# Altium footprint library Connectors THD.PcbLib: 631 footprints (part 43 of 46)
Each footprint in its own frame and in the unit in brackets; x right, y up, seen from the top. Pads: shape width x height; smd on the part's side, far side on the other; paste and mask are expansions set on the pad; w line width, h text height; cw(c..) or ccw(c..) is an arc to the next point about the centre after c.
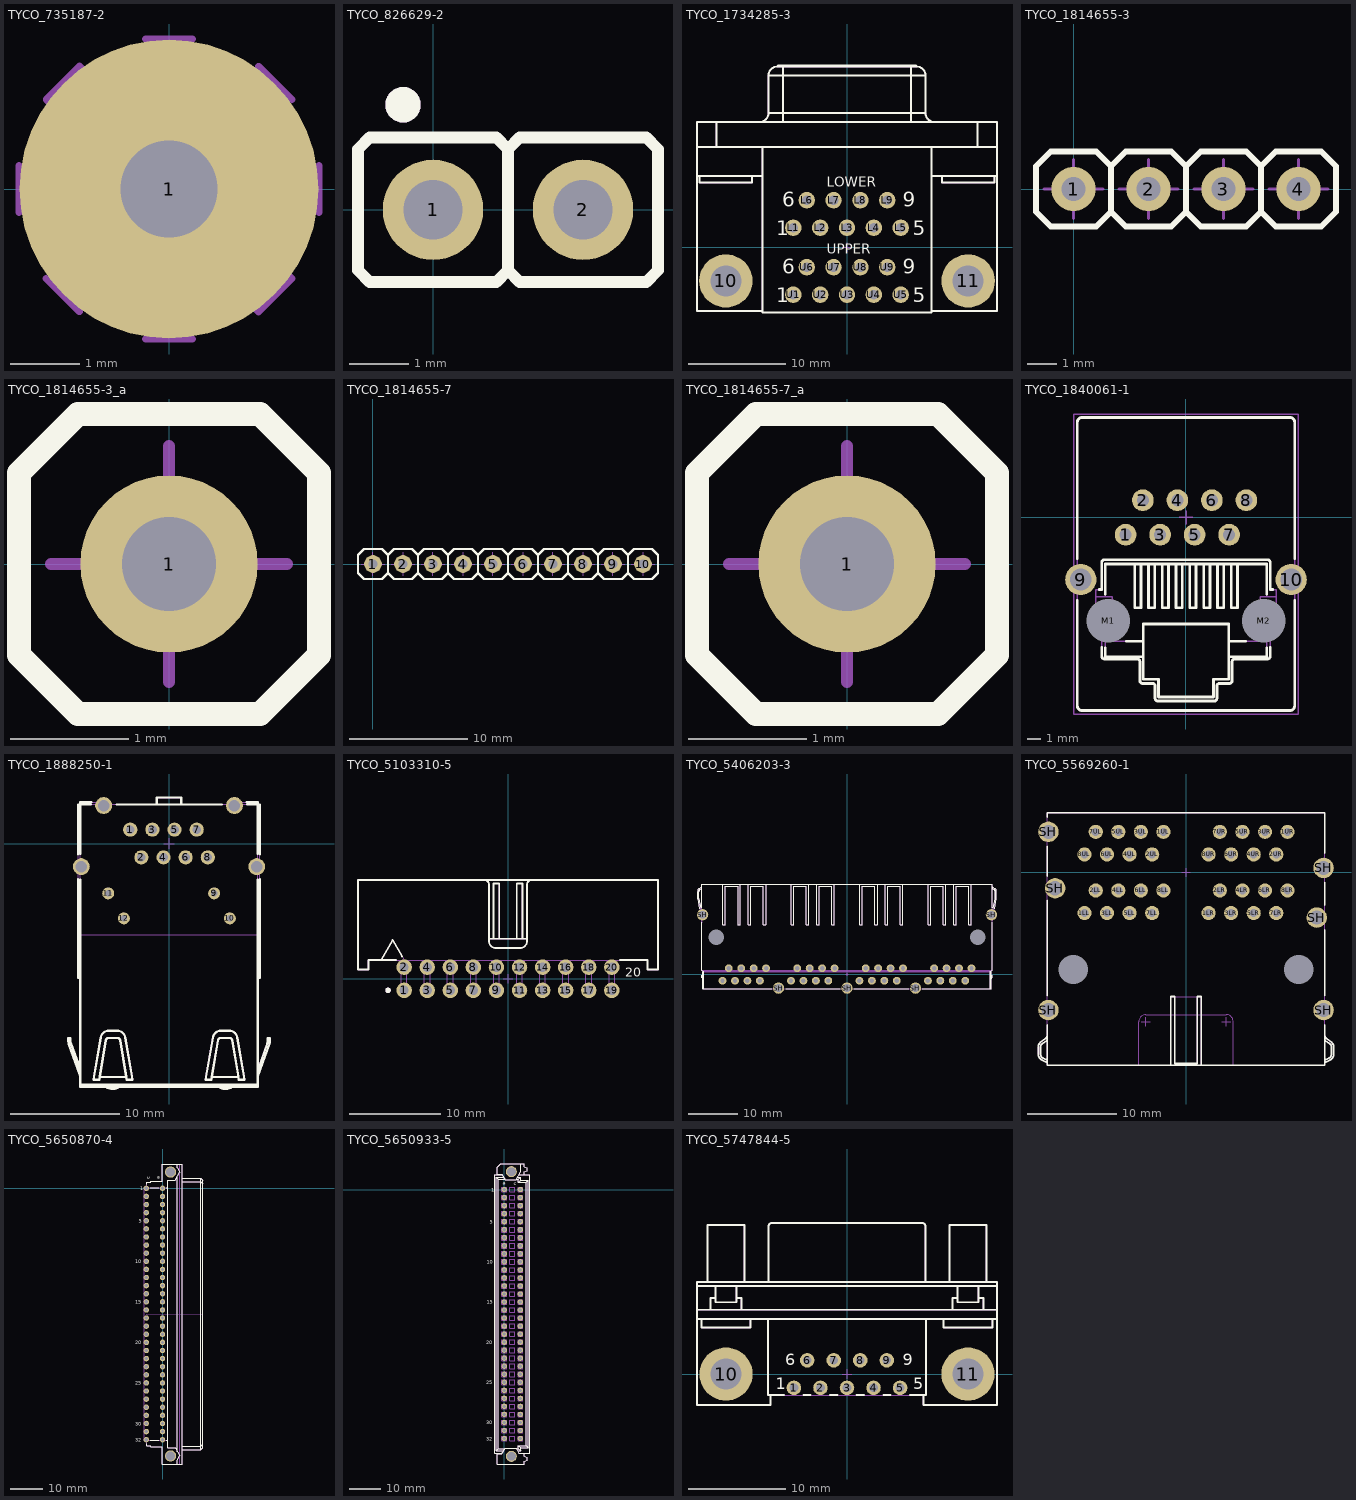
[diagram p42: the footprints below, top view; thin cyan lines are the x and y axes]

## TYCO_735187-2 [mm] "2.8mm FASTON Tab For PC Board (1.4mm hole)"
height 8.6
pads (1):
  round 4.3 hole 1.4 mask-0.7: 1(0,0)
Mechanical 14:
  lines w0.1: -2.159,-0.34 -2.159,0.34 ; -1.767,-1.286 -1.286,-1.767 ; -0.34,-2.159 0.34,-2.159 ; -0.34,2.159 0.34,2.159 ; 1.286,1.767 1.767,1.286 ; 2.159,-0.34 2.159,0.34 ; -1.767,1.286 -1.286,1.767 1.767,-1.286 1.286,-1.767 -1.767,1.286
3D body: height 8.64, standoff -3.81, extent -1.642,-1.642 1.767,1.767

## TYCO_826629-2 [mm] "2 Contacts Straight Strip Header Pitch 2.54mm L=6.7mm ''Mini-Wire-Wrap''"
height 9.5
pads (2):
  round 1.7 hole 1: 1(0,0) 2(2.54,0)
Top Overlay:
  circle w0.3: c-0.508,1.778 r0.15
  lines w0.2: 1.27,-1.025 1.47,-1.225 3.61,-1.225 3.81,-1.025 3.81,1.025 3.61,1.225 1.47,1.225 1.27,1.025 ; 1.27,-1.025 1.27,1.025 ; 1.27,-1.025 1.07,-1.225 -1.07,-1.225 -1.27,-1.025 -1.27,1.025 -1.07,1.225 1.07,1.225 1.27,1.025
Mechanical 14:
  circle w0.3: c-0.508,1.778 r0.15
  lines w0.1: 1.27,-1.025 1.47,-1.225 3.61,-1.225 3.81,-1.025 3.81,1.025 3.61,1.225 1.47,1.225 1.27,1.025 ; 1.27,-1.025 1.27,1.025 ; 1.27,-1.025 1.07,-1.225 -1.07,-1.225 -1.27,-1.025 -1.27,1.025 -1.07,1.225 1.07,1.225 1.27,1.025
3D body: height 9.5, standoff -3.2, extent -1.22,-1.25 3.86,1.25

## TYCO_1734285-3 [mm] "Dual Stacked  Right Angled D-SUB 9 Pins Female Connector, With Threaded Insert UNC 4-40, And PCB Mount Retention"
height 31.9
pads (20):
  round 5.5 hole 3.2: 10(-12.495,-3.455) 11(12.495,-3.455)
  round 1.7 hole 1: L1(-5.54,2.035) L2(-2.77,2.035) L3(0,2.035) L4(2.77,2.035) L5(5.54,2.035) L6(-4.155,4.875) L7(-1.385,4.875) L8(1.385,4.875) L9(4.155,4.875) U1(-5.54,-4.875) U2(-2.77,-4.875) U3(0,-4.875) U4(2.77,-4.875) U5(5.54,-4.875) U6(-4.155,-2.035) U7(-1.385,-2.035) U8(1.385,-2.035) U9(4.155,-2.035)
Top Overlay:
  lines w0.2: -15.475,7.355 -8.725,7.355 ; -15.475,10.355 15.475,10.355 ; -15.195,7.355 -15.195,6.691 -9.795,6.691 -9.795,7.355 ; -13.475,10.355 -13.475,12.955 ; -9,12.955 ccw(c-9,13.855) -8.1,13.855 ; -8.725,-6.545 -15.475,-6.545 -15.475,12.955 15.475,12.955 15.475,-6.545 8.725,-6.545 ; -8.725,10.355 -8.725,-6.695 8.725,-6.695 8.725,10.355 ; -7.1,18.655 -7.1,18.755 7.1,18.755 7.1,18.655 ; -6.6,12.955 -6.6,18.755 ; 6.6,12.955 6.6,18.755 ; 8.725,7.355 15.475,7.355 ; 9,12.955 cw(c9,13.855) 8.1,13.855 ; 9.795,7.355 9.795,6.691 15.195,6.691 15.195,7.355 ; 13.475,10.355 13.475,12.955 ; -8.1,13.855 -8.1,17.755 ; -8.1,13.855 8.1,13.855 ; -8.1,17.755 cw(c-7.2,17.755) -7.2,18.655 7.199,18.655 cw(c7.2,17.755) 8.1,17.755 ; -8.1,17.755 8.1,17.755 ; 8.1,13.855 8.1,17.755
  text "9" at 5.726,4.188 h1.5
  text "5" at 6.791,1.273 h1.5
  text "5" at 6.791,-5.637 h1.5
  text "9" at 5.726,-2.722 h1.5
  text "LOWER" at -2.1,6.26 h1
  text "UPPER" at -2.1,-0.65 h1
  text "1" at -7.299,1.273 h1.5
  text "6" at -6.661,4.188 h1.5
  text "6" at -6.661,-2.722 h1.5
  text "1" at -7.299,-5.637 h1.5
Mechanical 7:
  lines w0.1: -12.995,-3.455 -12.495,-3.455 ; -12.495,-3.955 -12.495,-3.455 ; -12.495,-2.955 -12.495,-3.455 ; -11.995,-3.455 -12.495,-3.455 ; 11.995,-3.455 12.495,-3.455 ; 12.495,-3.955 12.495,-3.455 ; 12.495,-2.955 12.495,-3.455 ; 12.995,-3.455 12.495,-3.455
Mechanical 8:
  lines w0.1: -6.04,-4.875 -5.54,-4.875 ; -6.04,2.035 -5.54,2.035 ; -5.54,-5.375 -5.54,-4.875 ; -5.54,-4.375 -5.54,-4.875 ; -5.54,1.535 -5.54,2.035 ; -5.54,2.535 -5.54,2.035 ; -5.04,-4.875 -5.54,-4.875 ; -5.04,2.035 -5.54,2.035 ; -4.655,-2.035 -4.155,-2.035 ; -4.655,4.875 -4.155,4.875 ; -4.155,-2.535 -4.155,-2.035 ; -4.155,-1.535 -4.155,-2.035 ; -4.155,4.375 -4.155,4.875 ; -4.155,5.375 -4.155,4.875 ; -3.655,-2.035 -4.155,-2.035 ; -3.655,4.875 -4.155,4.875 ; -3.27,-4.875 -2.77,-4.875 ; -3.27,2.035 -2.77,2.035 ; -2.77,-5.375 -2.77,-4.875 ; -2.77,-4.375 -2.77,-4.875 ; -2.77,1.535 -2.77,2.035 ; -2.77,2.535 -2.77,2.035 ; -2.27,-4.875 -2.77,-4.875 ; -2.27,2.035 -2.77,2.035 ; -1.885,-2.035 -1.385,-2.035 ; -1.885,4.875 -1.385,4.875 ; -1.385,-2.535 -1.385,-2.035 ; -1.385,-1.535 -1.385,-2.035 ; -1.385,4.375 -1.385,4.875 ; -1.385,5.375 -1.385,4.875 ; -0.885,-2.035 -1.385,-2.035 ; -0.885,4.875 -1.385,4.875 ; -0.5,-4.875 0,-4.875 ; -0.5,0 0,0 ; -0.5,2.035 0,2.035 ; 0,-5.375 0,-4.875 ; 0,-4.375 0,-4.875 ; 0,-0.5 0,0 ; 0,0.5 0,0 ; 0,1.535 0,2.035 ; 0,2.535 0,2.035 ; 0.5,-4.875 0,-4.875 ; 0.5,0 0,0 ; 0.5,2.035 0,2.035 ; 0.885,-2.035 1.385,-2.035 ; 0.885,4.875 1.385,4.875 ; 1.385,-2.535 1.385,-2.035 ; 1.385,-1.535 1.385,-2.035 ; 1.385,4.375 1.385,4.875 ; 1.385,5.375 1.385,4.875 ; 1.885,-2.035 1.385,-2.035 ; 1.885,4.875 1.385,4.875 ; 2.27,-4.875 2.77,-4.875 ; 2.27,2.035 2.77,2.035 ; 2.77,-5.375 2.77,-4.875 ; 2.77,-4.375 2.77,-4.875 ; 2.77,1.535 2.77,2.035 ; 2.77,2.535 2.77,2.035 ; 3.27,-4.875 2.77,-4.875 ; 3.27,2.035 2.77,2.035 ; 3.655,-2.035 4.155,-2.035 ; 3.655,4.875 4.155,4.875 ; 4.155,-2.535 4.155,-2.035 ; 4.155,-1.535 4.155,-2.035 ; 4.155,4.375 4.155,4.875 ; 4.155,5.375 4.155,4.875 ; 4.655,-2.035 4.155,-2.035 ; 4.655,4.875 4.155,4.875 ; 5.04,-4.875 5.54,-4.875 ; 5.04,2.035 5.54,2.035 ; 5.54,-5.375 5.54,-4.875 ; 5.54,-4.375 5.54,-4.875 ; 5.54,1.535 5.54,2.035 ; 5.54,2.535 5.54,2.035 ; 6.04,-4.875 5.54,-4.875 ; 6.04,2.035 5.54,2.035
Mechanical 14:
  drawing of 6657 lines, arcs and shapes, not listed
  text "LOWER" at -2.1,6.26 h1
  text "UPPER" at -2.1,-0.65 h1
  text "1" at -7.299,-5.637 h1.5
  text "6" at -6.661,-2.722 h1.5
  text "6" at -6.661,4.188 h1.5
  text "1" at -7.299,1.273 h1.5
  text "9" at 5.726,-2.722 h1.5
  text "5" at 6.791,-5.637 h1.5
  text "5" at 6.791,1.273 h1.5
  text "9" at 5.726,4.188 h1.5
3D body: height 31.6, standoff -3.55, extent -15.475,-6.695 15.475,18.805

## TYCO_1814655-3 [mm] "4 Positions, Pitch 2.54mm, Width 2.54mm, Heigh 4.4mm, SIP Straight Socket"
height 4.4
pads (4):
  round 1.5 hole 0.8: 1(0,0) 2(2.54,0) 3(5.08,0) 4(7.62,0)
Top Overlay:
  lines w0.2: 1.27,-0.77 1.27,0.77 ; 1.27,-0.77 1.77,-1.27 3.31,-1.27 3.81,-0.77 ; 1.27,-0.77 0.77,-1.27 -0.77,-1.27 -1.27,-0.77 -1.27,0.77 -0.77,1.27 0.77,1.27 1.27,0.77 ; 1.27,0.77 1.77,1.27 3.31,1.27 3.81,0.77 ; 3.81,-0.77 3.81,0.77 ; 3.81,-0.77 4.31,-1.27 5.85,-1.27 6.35,-0.77 ; 3.81,0.77 4.31,1.27 5.85,1.27 6.35,0.77 ; 6.35,-0.77 6.35,0.77 ; 6.35,-0.77 6.85,-1.27 8.39,-1.27 8.89,-0.77 8.89,0.77 8.39,1.27 6.85,1.27 6.35,0.77
Mechanical 8:
  lines w0.1: -1,0 0,0 ; 0,-1 0,0 ; 0,1 0,0 ; 1,0 0,0 ; 1.54,0 2.54,0 ; 2.54,-1 2.54,0 ; 2.54,1 2.54,0 ; 3.54,0 2.54,0 ; 4.08,0 5.08,0 ; 5.08,-1 5.08,0 ; 5.08,1 5.08,0 ; 6.08,0 5.08,0 ; 6.62,0 7.62,0 ; 7.62,-1 7.62,0 ; 7.62,1 7.62,0 ; 8.62,0 7.62,0
Mechanical 14:
  lines w0.1: 1.27,-0.77 1.27,0.77 ; 1.27,-0.77 1.77,-1.27 3.31,-1.27 3.81,-0.77 ; 1.27,-0.77 0.77,-1.27 -0.77,-1.27 -1.27,-0.77 -1.27,0.77 -0.77,1.27 0.77,1.27 1.27,0.77 ; 1.27,0.77 1.77,1.27 3.31,1.27 3.81,0.77 ; 3.81,-0.77 3.81,0.77 ; 3.81,-0.77 4.31,-1.27 5.85,-1.27 6.35,-0.77 ; 3.81,0.77 4.31,1.27 5.85,1.27 6.35,0.77 ; 6.35,-0.77 6.35,0.77 ; 6.35,-0.77 6.85,-1.27 8.39,-1.27 8.89,-0.77 8.89,0.77 8.39,1.27 6.85,1.27 6.35,0.77
3D body: height 4.4, standoff -2.9, extent -1.27,-1.27 8.89,1.27

## TYCO_1814655-3_a [mm] "1 of 4 Positions, Pitch 2.54mm, Width 2.54mm, Heigh 4.4mm, SIP Straight Socket"
height 4.4
pads (1):
  round 1.5 hole 0.8: 1(0,0)
Top Overlay:
  lines w0.2: -1.27,-0.77 -0.77,-1.27 0.77,-1.27 1.27,-0.77 1.27,0.77 0.77,1.27 -0.77,1.27 -1.27,0.77 -1.27,-0.77
Mechanical 8:
  lines w0.1: -1,0 0,0 ; 0,-1 0,0 ; 0,1 0,0 ; 1,0 0,0
Mechanical 14:
  lines w0.1: -1.27,-0.77 -0.77,-1.27 0.77,-1.27 1.27,-0.77 1.27,0.77 0.77,1.27 -0.77,1.27 -1.27,0.77 -1.27,-0.77
3D body: height 4.4, standoff -2.9, extent -1.27,-1.27 1.27,1.27

## TYCO_1814655-7 [mm] "10 Positions, Pitch 2.54mm, Width 2.54mm, Heigh 4.4mm, SIP Straight Socket"
height 4.4
pads (10):
  round 1.5 hole 0.8: 1(0,0) 2(2.54,0) 3(5.08,0) 4(7.62,0) 5(10.16,0) 6(12.7,0) 7(15.24,0) 8(17.78,0) 9(20.32,0) 10(22.86,0)
Top Overlay:
  lines w0.2: 1.27,-0.77 1.27,0.77 ; 1.27,-0.77 1.77,-1.27 3.31,-1.27 3.81,-0.77 ; 1.27,-0.77 0.77,-1.27 -0.77,-1.27 -1.27,-0.77 -1.27,0.77 -0.77,1.27 0.77,1.27 1.27,0.77 ; 1.27,0.77 1.77,1.27 3.31,1.27 3.81,0.77 ; 3.81,-0.77 3.81,0.77 ; 3.81,-0.77 4.31,-1.27 5.85,-1.27 6.35,-0.77 ; 3.81,0.77 4.31,1.27 5.85,1.27 6.35,0.77 ; 6.35,-0.77 6.35,0.77 ; 6.35,-0.77 6.85,-1.27 8.39,-1.27 8.89,-0.77 ; 6.35,0.77 6.85,1.27 8.39,1.27 8.89,0.77 ; 8.89,-0.77 8.89,0.77 ; 8.89,-0.77 9.39,-1.27 10.93,-1.27 11.43,-0.77 ; 8.89,0.77 9.39,1.27 10.93,1.27 11.43,0.77 ; 11.43,-0.77 11.43,0.77 ; 11.43,-0.77 11.93,-1.27 13.47,-1.27 13.97,-0.77 ; 11.43,0.77 11.93,1.27 13.47,1.27 13.97,0.77 ; 13.97,-0.77 13.97,0.77 ; 13.97,-0.77 14.47,-1.27 16.01,-1.27 16.51,-0.77 ; 13.97,0.77 14.47,1.27 16.01,1.27 16.51,0.77 ; 16.51,-0.77 16.51,0.77 ; 16.51,-0.77 17.01,-1.27 18.55,-1.27 19.05,-0.77 ; 16.51,0.77 17.01,1.27 18.55,1.27 19.05,0.77 ; 19.05,-0.77 19.05,0.77 ; 19.05,-0.77 19.55,-1.27 21.09,-1.27 21.59,-0.77 ; 19.05,0.77 19.55,1.27 21.09,1.27 21.59,0.77 ; 21.59,-0.77 21.59,0.77 ; 21.59,-0.77 22.09,-1.27 23.63,-1.27 24.13,-0.77 24.13,0.77 23.63,1.27 22.09,1.27 21.59,0.77
Mechanical 8:
  lines w0.1: -1,0 0,0 ; 0,-1 0,0 ; 0,1 0,0 ; 1,0 0,0 ; 1.54,0 2.54,0 ; 2.54,-1 2.54,0 ; 2.54,1 2.54,0 ; 3.54,0 2.54,0 ; 4.08,0 5.08,0 ; 5.08,-1 5.08,0 ; 5.08,1 5.08,0 ; 6.08,0 5.08,0 ; 6.62,0 7.62,0 ; 7.62,-1 7.62,0 ; 7.62,1 7.62,0 ; 8.62,0 7.62,0 ; 9.16,0 10.16,0 ; 10.16,-1 10.16,0 ; 10.16,1 10.16,0 ; 11.16,0 10.16,0 ; 11.7,0 12.7,0 ; 12.7,-1 12.7,0 ; 12.7,1 12.7,0 ; 13.7,0 12.7,0 ; 14.24,0 15.24,0 ; 15.24,-1 15.24,0 ; 15.24,1 15.24,0 ; 16.24,0 15.24,0 ; 16.78,0 17.78,0 ; 17.78,-1 17.78,0 ; 17.78,1 17.78,0 ; 18.78,0 17.78,0 ; 19.32,0 20.32,0 ; 20.32,-1 20.32,0 ; 20.32,1 20.32,0 ; 21.32,0 20.32,0 ; 21.86,0 22.86,0 ; 22.86,-1 22.86,0 ; 22.86,1 22.86,0 ; 23.86,0 22.86,0
Mechanical 14:
  lines w0.1: 1.27,-0.77 1.27,0.77 ; 1.27,-0.77 1.77,-1.27 3.31,-1.27 3.81,-0.77 ; 1.27,-0.77 0.77,-1.27 -0.77,-1.27 -1.27,-0.77 -1.27,0.77 -0.77,1.27 0.77,1.27 1.27,0.77 ; 1.27,0.77 1.77,1.27 3.31,1.27 3.81,0.77 ; 3.81,-0.77 3.81,0.77 ; 3.81,-0.77 4.31,-1.27 5.85,-1.27 6.35,-0.77 ; 3.81,0.77 4.31,1.27 5.85,1.27 6.35,0.77 ; 6.35,-0.77 6.35,0.77 ; 6.35,-0.77 6.85,-1.27 8.39,-1.27 8.89,-0.77 ; 6.35,0.77 6.85,1.27 8.39,1.27 8.89,0.77 ; 8.89,-0.77 8.89,0.77 ; 8.89,-0.77 9.39,-1.27 10.93,-1.27 11.43,-0.77 ; 8.89,0.77 9.39,1.27 10.93,1.27 11.43,0.77 ; 11.43,-0.77 11.43,0.77 ; 11.43,-0.77 11.93,-1.27 13.47,-1.27 13.97,-0.77 ; 11.43,0.77 11.93,1.27 13.47,1.27 13.97,0.77 ; 13.97,-0.77 13.97,0.77 ; 13.97,-0.77 14.47,-1.27 16.01,-1.27 16.51,-0.77 ; 13.97,0.77 14.47,1.27 16.01,1.27 16.51,0.77 ; 16.51,-0.77 16.51,0.77 ; 16.51,-0.77 17.01,-1.27 18.55,-1.27 19.05,-0.77 ; 16.51,0.77 17.01,1.27 18.55,1.27 19.05,0.77 ; 19.05,-0.77 19.05,0.77 ; 19.05,-0.77 19.55,-1.27 21.09,-1.27 21.59,-0.77 ; 19.05,0.77 19.55,1.27 21.09,1.27 21.59,0.77 ; 21.59,-0.77 21.59,0.77 ; 21.59,-0.77 22.09,-1.27 23.63,-1.27 24.13,-0.77 24.13,0.77 23.63,1.27 22.09,1.27 21.59,0.77
3D body: height 4.4, standoff -2.9, extent -1.27,-1.27 24.13,1.27

## TYCO_1814655-7_a [mm] "1 of 10 Positions, Pitch 2.54mm, Width 2.54mm, Heigh 4.4mm, SIP Straight Socket"
height 4.4
pads (1):
  round 1.5 hole 0.8: 1(0,0)
Top Overlay:
  lines w0.2: -1.27,-0.77 -0.77,-1.27 0.77,-1.27 1.27,-0.77 1.27,0.77 0.77,1.27 -0.77,1.27 -1.27,0.77 -1.27,-0.77
Mechanical 8:
  lines w0.1: -1,0 0,0 ; 0,-1 0,0 ; 0,1 0,0 ; 1,0 0,0
Mechanical 14:
  lines w0.1: -1.27,-0.77 -0.77,-1.27 0.77,-1.27 1.27,-0.77 1.27,0.77 0.77,1.27 -0.77,1.27 -1.27,0.77 -1.27,-0.77
3D body: height 4.4, standoff -2.9, extent -1.27,-1.27 1.27,1.27

## TYCO_1840061-1 [mm] "1 Port, Without LED, RJ45 10/100Base-T Ethernet Vertical Connector Module With Integrated Magnetics"
height 16.51
pads (12):
  round 1.6 hole 0.9: 1(-4.445,-1.27) 2(-3.175,1.27) 3(-1.905,-1.27) 4(-0.635,1.27) 5(0.635,-1.27) 6(1.905,1.27) 7(3.175,-1.27) 8(4.445,1.27)
  round 2.3 hole 1.6: 9(-7.747,-4.572) 10(7.747,-4.572)
  round 1 hole 3.2 unplated mask+1.1: M1(-5.715,-7.62) M2(5.715,-7.62)
Top Overlay:
  lines w0.2: -8,-6.101 -8,-13.87 ccw(c-7.65,-13.87) -7.65,-14.22 7.65,-14.22 ccw(c7.65,-13.87) 8,-13.87 8,-6.101 ; -8,-3.043 -8,7.02 cw(c-7.65,7.02) -7.65,7.37 7.65,7.37 cw(c7.65,7.02) 8,7.02 8,-3.043 ; -6.382,-5.31 -6.2,-5.31 -6.2,-3.31 cw(c-6,-3.31) -6,-3.11 6,-3.11 cw(c6,-3.31) 6.2,-3.31 6.2,-5.31 6.382,-5.31 ; -6.2,-9.562 -6.2,-10.22 ccw(c-6,-10.22) -6,-10.42 -3.595,-10.42 cw(c-3.595,-10.62) -3.395,-10.62 -3.395,-12.02 ccw(c-3.195,-12.02) -3.195,-12.22 -2.475,-12.22 cw(c-2.475,-12.42) -2.275,-12.42 -2.275,-13.32 ccw(c-2.075,-13.32) -2.075,-13.52 2.075,-13.52 ccw(c2.075,-13.32) 2.275,-13.32 2.275,-12.42 cw(c2.475,-12.42) 2.475,-12.22 3.195,-12.22 ccw(c3.195,-12.02) 3.395,-12.02 3.395,-10.62 cw(c3.595,-10.62) 3.595,-10.42 6,-10.42 ccw(c6,-10.22) 6.2,-10.22 6.2,-9.562 ; -5.955,-9.607 -5.955,-10.25 -3.15,-10.25 ; -5.955,-5.636 -5.955,-3.42 5.955,-3.42 5.955,-5.636 ; -4.379,-9.11 -3.15,-9.11 ; -3.78,-3.42 -3.78,-6.654 -3.32,-6.654 -3.32,-3.42 ; -2.764,-3.42 -2.764,-6.654 -2.304,-6.654 -2.304,-3.42 ; -1.748,-3.42 -1.748,-6.654 -1.288,-6.654 -1.288,-3.42 ; -0.732,-3.42 -0.732,-6.654 -0.272,-6.654 -0.272,-3.42 ; 0.284,-3.42 0.284,-6.654 0.744,-6.654 0.744,-3.42 ; 1.3,-3.42 1.3,-6.654 1.76,-6.654 1.76,-3.42 ; 2.316,-3.42 2.316,-6.654 2.776,-6.654 2.776,-3.42 ; 3.15,-10.25 5.955,-10.25 5.955,-9.607 ; 3.15,-9.11 4.379,-9.11 ; 3.332,-3.42 3.332,-6.654 3.792,-6.654 3.792,-3.42 ; -3.15,-11.92 -2.03,-11.92 -2.03,-13.22 2.03,-13.22 2.03,-11.92 3.15,-11.92 3.15,-7.84 -3.15,-7.84 -3.15,-11.92
Mechanical 8:
  lines w0.1: -8.245,-4.572 -7.745,-4.572 ; -7.745,-5.072 -7.745,-4.572 ; -7.745,-4.072 -7.745,-4.572 ; -7.245,-4.572 -7.745,-4.572 ; -6.215,-7.622 -5.715,-7.622 ; -5.715,-8.122 -5.715,-7.622 ; -5.715,-7.122 -5.715,-7.622 ; -5.215,-7.622 -5.715,-7.622 ; -4.945,-1.272 -4.445,-1.272 ; -4.445,-1.772 -4.445,-1.272 ; -4.445,-0.772 -4.445,-1.272 ; -3.945,-1.272 -4.445,-1.272 ; -3.675,1.268 -3.175,1.268 ; -3.175,0.768 -3.175,1.268 ; -3.175,1.768 -3.175,1.268 ; -2.675,1.268 -3.175,1.268 ; -2.405,-1.272 -1.905,-1.272 ; -1.905,-1.772 -1.905,-1.272 ; -1.905,-0.772 -1.905,-1.272 ; -1.405,-1.272 -1.905,-1.272 ; -1.135,1.268 -0.635,1.268 ; -0.635,0.768 -0.635,1.268 ; -0.635,1.768 -0.635,1.268 ; -0.5,0 0,0 ; -0.135,1.268 -0.635,1.268 ; 0,-0.5 0,0 ; 0,0.5 0,0 ; 0.135,-1.272 0.635,-1.272 ; 0.5,0 0,0 ; 0.635,-1.772 0.635,-1.272 ; 0.635,-0.772 0.635,-1.272 ; 1.135,-1.272 0.635,-1.272 ; 1.405,1.268 1.905,1.268 ; 1.905,0.768 1.905,1.268 ; 1.905,1.768 1.905,1.268 ; 2.405,1.268 1.905,1.268 ; 2.675,-1.272 3.175,-1.272 ; 3.175,-1.772 3.175,-1.272 ; 3.175,-0.772 3.175,-1.272 ; 3.675,-1.272 3.175,-1.272 ; 3.945,1.268 4.445,1.268 ; 4.445,0.768 4.445,1.268 ; 4.445,1.768 4.445,1.268 ; 4.945,1.268 4.445,1.268 ; 5.215,-7.622 5.715,-7.622 ; 5.715,-8.122 5.715,-7.622 ; 5.715,-7.122 5.715,-7.622 ; 6.215,-7.622 5.715,-7.622 ; 7.245,-4.572 7.745,-4.572 ; 7.745,-5.072 7.745,-4.572 ; 7.745,-4.072 7.745,-4.572 ; 8.245,-4.572 7.745,-4.572
Mechanical 14:
  lines w0.1: -6.635,-7.85 -5.449,-7.85 -5.449,-5.82 -6.635,-5.82 ; -5.955,-9.11 -3.15,-9.11 ; -5.955,-7.85 -5.955,-10.25 -3.15,-10.25 ; -5.955,-5.82 -5.955,-3.42 5.955,-3.42 5.955,-5.82 ; -3.78,-3.42 -3.78,-6.654 -3.32,-6.654 -3.32,-3.42 ; -2.764,-3.42 -2.764,-6.654 -2.304,-6.654 -2.304,-3.42 ; -1.748,-3.42 -1.748,-6.654 -1.288,-6.654 -1.288,-3.42 ; -0.732,-3.42 -0.732,-6.654 -0.272,-6.654 -0.272,-3.42 ; 0.284,-3.42 0.284,-6.654 0.744,-6.654 0.744,-3.42 ; 1.3,-3.42 1.3,-6.654 1.76,-6.654 1.76,-3.42 ; 2.316,-3.42 2.316,-6.654 2.776,-6.654 2.776,-3.42 ; 3.15,-10.25 5.955,-10.25 5.955,-7.85 ; 3.15,-9.11 5.954,-9.11 ; 3.332,-3.42 3.332,-6.654 3.792,-6.654 3.792,-3.42 ; 6.635,-7.85 5.48,-7.85 5.48,-5.82 6.635,-5.82 ; -8,-13.87 ccw(c-7.65,-13.87) -7.65,-14.22 7.65,-14.22 ccw(c7.65,-13.87) 8,-13.87 8,7.02 ccw(c7.65,7.02) 7.65,7.37 -7.65,7.37 ccw(c-7.65,7.02) -8,7.02 -8,-13.87 ; -6.635,-8.36 -6.635,-5.31 -6.2,-5.31 -6.2,-3.31 cw(c-6,-3.31) -6,-3.11 6,-3.11 cw(c6,-3.31) 6.2,-3.31 6.2,-5.31 6.635,-5.31 6.635,-8.36 6.2,-8.36 6.2,-10.22 cw(c6,-10.22) 6,-10.42 3.595,-10.42 ccw(c3.595,-10.62) 3.395,-10.62 3.395,-12.02 cw(c3.195,-12.02) 3.195,-12.22 2.475,-12.22 ccw(c2.475,-12.42) 2.275,-12.42 2.275,-13.32 cw(c2.075,-13.32) 2.075,-13.52 -2.075,-13.52 cw(c-2.075,-13.32) -2.275,-13.32 -2.275,-12.42 ccw(c-2.475,-12.42) -2.475,-12.22 -3.195,-12.22 cw(c-3.195,-12.02) -3.395,-12.02 -3.395,-10.62 ccw(c-3.595,-10.62) -3.595,-10.42 -6,-10.42 cw(c-6,-10.22) -6.2,-10.22 -6.2,-8.36 -6.635,-8.36 ; -3.15,-11.92 -2.03,-11.92 -2.03,-13.22 2.03,-13.22 2.03,-11.92 3.15,-11.92 3.15,-7.84 -3.15,-7.84 -3.15,-11.92
Mechanical 15:
  lines w0.1: -8.25,-14.47 8.25,-14.47 8.25,7.62 -8.25,7.62 -8.25,-14.47
3D body: height 16.51, standoff -4, extent -8,-14.22 8,7.37

## TYCO_1888250-1 [mm] "1 Port, Yellow/Green LEDs, RJ45 10/100Base-T, Cat 5, Ethernet Connector Module"
height 7.38
pads (16):
  round 1.3 hole 0.8: 1(-3.556,1.27) 2(-2.54,-1.27) 3(-1.524,1.27) 4(-0.508,-1.27) 5(0.508,1.27) 6(1.524,-1.27) 7(2.54,1.27) 8(3.556,-1.27)
  round 1.1 hole 0.6: 9(4.14,-4.57) 10(5.58,-6.87) 11(-5.58,-4.57) 12(-4.14,-6.87)
  round 1.55 hole 1.05: SHIELD(-8.045,-2.12) SHIELD(-6,3.48) SHIELD(6,3.48) SHIELD(8.045,-2.12)
Top Overlay:
  lines w0.2: -8.345,-3.256 -8.345,-12.32 -8.145,-12.32 ; -8.345,-0.984 -8.345,3.58 -7.171,3.58 ; -8.145,-22.12 8.145,-22.12 ; -8.145,-20.703 -9.015,-18.311 cw(c-8.545,-18.14) -9.045,-18.14 -9.045,-17.84 -9.245,-17.84 -9.245,-18.14 ccw(c-8.545,-18.14) -9.203,-18.379 -8.19,-21.164 ; -8.145,-3.291 -8.145,-22.32 8.145,-22.32 8.145,-3.291 ; -8.145,-0.949 -8.145,3.78 -7.136,3.78 ; -5.841,-22.326 ccw(c-5.029,-20.72) -5.16,-22.515 ccw(c-5.291,-20.72) -4.47,-22.322 ; -4.829,3.58 4.829,3.58 ; -4.482,-18.052 ccw(c-4.729,-18.09) -4.729,-17.84 -5.551,-17.84 ccw(c-5.551,-18.09) -5.798,-18.052 -6.359,-21.42 ; -4.475,-18.051 -3.921,-21.42 ; -1.119,3.58 -1.119,4.22 1.125,4.22 1.125,3.58 ; 4.471,-22.322 ccw(c5.291,-20.72) 5.16,-22.515 ccw(c5.029,-20.72) 5.843,-22.325 ; 5.798,-18.052 ccw(c5.551,-18.09) 5.551,-17.84 4.729,-17.84 ccw(c4.729,-18.09) 4.482,-18.052 3.921,-21.42 ; 5.805,-18.051 6.359,-21.42 ; 7.136,3.78 8.145,3.78 8.145,-0.949 ; 7.171,3.58 8.345,3.58 8.345,-0.984 ; 8.145,-21.42 8.165,-21.303 9.205,-18.374 ccw(c8.545,-18.14) 9.245,-18.14 ; 8.145,-20.762 9.016,-18.307 ccw(c8.545,-18.14) 9.045,-18.14 9.045,-17.84 9.245,-17.84 9.245,-18.143 ; 8.145,-12.32 8.345,-12.32 8.345,-3.256 ; -8.19,-21.164 -8.145,-21.42 -8.19,-21.164 ; -6.359,-21.42 -6.39,-21.67 -6.938,-21.67 -6.257,-17.79 cw(c-5.519,-17.92) -5.519,-17.17 -4.761,-17.17 cw(c-4.761,-17.92) -4.023,-17.79 -3.342,-21.67 -3.89,-21.67 -3.921,-21.42 ; -6.359,-21.42 -3.921,-21.42 ; 3.921,-21.42 3.89,-21.67 3.342,-21.67 4.023,-17.79 cw(c4.761,-17.92) 4.761,-17.17 5.519,-17.17 cw(c5.519,-17.92) 6.257,-17.79 6.938,-21.67 6.39,-21.67 6.359,-21.42 ; 3.921,-21.42 6.359,-21.42
Mechanical 8:
  lines w0.1: -8.545,-2.12 -8.045,-2.12 ; -8.15,-8.37 8.15,-8.37 ; -8.045,-2.62 -8.045,-2.12 ; -8.045,-1.62 -8.045,-2.12 ; -7.545,-2.12 -8.045,-2.12 ; -6.5,3.48 -6,3.48 ; -6.08,-4.57 -5.58,-4.57 ; -6,2.98 -6,3.48 ; -6,3.98 -6,3.48 ; -5.58,-5.07 -5.58,-4.57 ; -5.58,-4.07 -5.58,-4.57 ; -5.5,3.48 -6,3.48 ; -5.08,-4.57 -5.58,-4.57 ; -4.64,-6.87 -4.14,-6.87 ; -4.14,-7.37 -4.14,-6.87 ; -4.14,-6.37 -4.14,-6.87 ; -4.056,1.27 -3.556,1.27 ; -3.64,-6.87 -4.14,-6.87 ; -3.556,0.77 -3.556,1.27 ; -3.556,1.77 -3.556,1.27 ; -3.056,1.27 -3.556,1.27 ; -3.04,-1.27 -2.54,-1.27 ; -2.54,-1.77 -2.54,-1.27 ; -2.54,-0.77 -2.54,-1.27 ; -2.04,-1.27 -2.54,-1.27 ; -2.024,1.27 -1.524,1.27 ; -1.524,0.77 -1.524,1.27 ; -1.524,1.77 -1.524,1.27 ; -1.024,1.27 -1.524,1.27 ; -1.008,-1.27 -0.508,-1.27 ; -0.508,-1.77 -0.508,-1.27 ; -0.508,-0.77 -0.508,-1.27 ; -0.5,0 0,0 ; -0.008,-1.27 -0.508,-1.27 ; 0,-0.5 0,0 ; 0,0.5 0,0 ; 0.008,1.27 0.508,1.27 ; 0.5,0 0,0 ; 0.508,0.77 0.508,1.27 ; 0.508,1.77 0.508,1.27 ; 1.008,1.27 0.508,1.27 ; 1.024,-1.27 1.524,-1.27 ; 1.524,-1.77 1.524,-1.27 ; 1.524,-0.77 1.524,-1.27 ; 2.024,-1.27 1.524,-1.27 ; 2.04,1.27 2.54,1.27 ; 2.54,0.77 2.54,1.27 ; 2.54,1.77 2.54,1.27 ; 3.04,1.27 2.54,1.27 ; 3.056,-1.27 3.556,-1.27 ; 3.556,-1.77 3.556,-1.27 ; 3.556,-0.77 3.556,-1.27 ; 3.64,-4.57 4.14,-4.57 ; 4.056,-1.27 3.556,-1.27 ; 4.14,-5.07 4.14,-4.57 ; 4.14,-4.07 4.14,-4.57 ; 4.64,-4.57 4.14,-4.57 ; 5.08,-6.87 5.58,-6.87 ; 5.5,3.48 6,3.48 ; 5.58,-7.37 5.58,-6.87 ; 5.58,-6.37 5.58,-6.87 ; 6,2.98 6,3.48 ; 6,3.98 6,3.48 ; 6.08,-6.87 5.58,-6.87 ; 6.5,3.48 6,3.48 ; 7.545,-2.12 8.045,-2.12 ; 8.045,-2.62 8.045,-2.12 ; 8.045,-1.62 8.045,-2.12 ; 8.545,-2.12 8.045,-2.12
Mechanical 14:
  lines w0.1: -8.145,-22.12 8.145,-22.12 ; -8.145,-20.703 -9.015,-18.311 cw(c-8.545,-18.14) -9.045,-18.14 -9.045,-17.84 -9.245,-17.84 -9.245,-18.14 ccw(c-8.545,-18.14) -9.203,-18.379 -8.19,-21.164 ; -8.145,-12.32 -8.345,-12.32 -8.345,3.58 8.345,3.58 8.345,-12.32 8.145,-12.32 ; -6.395,3.58 -6.395,3.78 -8.145,3.78 -8.145,-22.32 8.145,-22.32 8.145,3.78 6.395,3.78 6.395,3.58 ; -5.841,-22.326 ccw(c-5.029,-20.72) -5.16,-22.515 ccw(c-5.291,-20.72) -4.47,-22.322 ; -4.482,-18.052 ccw(c-4.729,-18.09) -4.729,-17.84 -5.551,-17.84 ccw(c-5.551,-18.09) -5.798,-18.052 -6.359,-21.42 ; -4.475,-18.051 -3.921,-21.42 ; -1.119,3.58 -1.119,4.22 1.125,4.22 1.125,3.58 ; 4.473,-22.323 ccw(c5.291,-20.72) 5.16,-22.515 ccw(c5.029,-20.72) 5.851,-22.321 ; 5.798,-18.052 ccw(c5.551,-18.09) 5.551,-17.84 4.729,-17.84 ccw(c4.729,-18.09) 4.482,-18.052 3.921,-21.42 ; 5.805,-18.051 6.359,-21.42 ; 8.145,-21.42 8.165,-21.303 9.205,-18.374 ccw(c8.545,-18.14) 9.245,-18.14 ; 8.145,-20.762 9.016,-18.307 ccw(c8.545,-18.14) 9.045,-18.14 9.045,-17.84 9.245,-17.84 9.245,-18.143 ; -8.19,-21.164 -8.145,-21.42 -8.19,-21.164 ; -6.359,-21.42 -6.39,-21.67 -6.938,-21.67 -6.257,-17.79 cw(c-5.519,-17.92) -5.519,-17.17 -4.761,-17.17 cw(c-4.761,-17.92) -4.023,-17.79 -3.342,-21.67 -3.89,-21.67 -3.921,-21.42 ; -6.359,-21.42 -3.921,-21.42 ; 3.921,-21.42 3.89,-21.67 3.342,-21.67 4.023,-17.79 cw(c4.761,-17.92) 4.761,-17.17 5.519,-17.17 cw(c5.519,-17.92) 6.257,-17.79 6.938,-21.67 6.39,-21.67 6.359,-21.42 ; 3.921,-21.42 6.359,-21.42